# Altium schematic symbol library Electronic Devices_LIB.SchLib: 703 symbols (part 3 of 8) (continued)
## IC_FLASH_MEMORY_SPI_AT25DF321A-MH-T
designator U?, comment Supplier Part Number 1: 1265-1076-1-ND  (hidden comment: AT25DF321A-MH-T)
Manufacturer: Renesas; Supplier 1: Digi-Key; Manufacturer Part Number: AT25DF321A-MH-T; RoHS: No; Stock 1: 101167; Pricing 1: 1=3.63, 10=3.297, 25=3.2252, 50=3.2078, 100=2.8762, 250=2.86576, 500=2.76104, 1000=2.6249 (USD)

## IC_FLASH_SPI_32MB_AT25DF321A-SH-B
designator U?, comment AT25DF321A-SH-B
FLASH Memory IC 32Mbit SPI 100 MHz 8-SOIC; Manufacturer: Renesas; Supplier 1: Digi-Key; Manufacturer Part Number: AT25DF321A-SH-B; RoHS: No; Category: Memory; Stock 1: 39259; Pricing 1: 1=2.76, 10=2.478, 25=2.4396, 50=2.4332, 100=2.1742, 250=2.10276, 500=2.09512, 1000=1.95093, 5000=1.76592 (USD); Supplier Part Number 1: 1265-1029-5-ND
footprint IC_FLASH_SOIC127P798X216-8N (8-SOIC)
pins: 1 ~{CS}, 2 SO_(SOI), 3 ~{WP}, 4 GND, 5 SI_(SIO), 6 SCK, 7 ~{HOLD}, 8 VCC

## IC_IMU_6AXIS_BMI055-SHUTL
designator U?, comment BMI055-SHUTL
Eval Board For BMI055; Manufacturer: Bosch Sensortec; Interface: I2C,SPI; Evaluation Kit: Yes; Sensor Type: Accelerometer,Gyroscope,3 Axis; Supplier 1: Digi-Key; Manufacturer Part Number: BMI055-SHUTL; RoHS: Yes; ComponentLink1URL: https://ae-bst.resource.bosch.com/media/_tech/media/shuttleboard_flyer/BST-DHW-FL020.pdf?src-supplier=Digi-Key; ComponentLink1Description: https://ae-bst.resource.bosch.com/media/_tech/media/shuttleboard_flyer/BST-DHW-FL020.pdf?src-supplier=Digi-Key; Supplier Part Number 1: 828-1051-ND
footprint IC_IMU_Bosch_Sensortec_0_MFG (16-LGA (4.5x3))
footprint Model Name (Model Description)
pins: 1 INT2, 2 NC, 3 VDD, 4 GNDA, 5 CSB2, 6 GNDIO, 7 PS, 8 SCx, 9 SDx, 10 SDO2, 11 VDDIO, 12 INT3, 13 INT4, 14 CSB1, 15 SDO1, 16 INT1

## IC_IMU_6AXIS_BMI270
designator U?, comment BMI270
BMI270 Series 3.6 V 685 µA Smart Ultra-low Power Inertial Measurement Unit; Manufacturer: Bosch Tools; Supplier 1: Digikey; Manufacturer Part Number: BMI270; RoHS: No; Category: Inertial Measurement Units (IMUs); Stock 1: 18476; Pricing 1: 1=5.88, 10=4.409, 25=3.9188, 50=3.7228, 100=3.6249, 500=3.03708, 1000=2.84113 (USD); Supplier Part Number 1: 828-1091-1-ND
footprint IC_IMU_QFN50P300X250X87-14N (14-LGA (2.5x3))
pins: 1 SDO, 2 ASDX, 3 ASCX, 4 INT1, 5 VDDIO, 6 GNDIO, 7 GND, 8 VDD, 9 INT2, 10 OCSB, 11 OSDO, 12 CSB, 13 SCX, 14 SDX

## IC_IMU_9AXIS_ICM-20948
designator U?, comment ICM-20948
IMU (Inertial Measurement Unit), 9-Axis, Accelerometer, Gyroscope, Compass; Manufacturer: TDK; Sensor Type: Accelerometer,Gyroscope,Magnetometer; Output Type: SPI,I2C; Max Supply Voltage: 3.6V; Min Supply Voltage: 1.71V; Supplier 1: Mouser; Manufacturer Part Number: ICM-20948; RoHS: Yes; Category: Inertial Measurement Units (IMUs); Stock 1: 38177; Pricing 1: 1=8.32, 10=6.38, 50=6.38, 100=5.45, 250=5.41, 500=5.13, 1000=4.8, 2500=4.76, 5000=4.61, 10000=4.61 (USD); Mount: Surface Mount; Case/Package: QFN; Min Operating Temperature: -40°C; Max Operating Temperature: 85°C; Series: -; Packaging: Cut Tape; Length: 3mm; Width: 3mm; Height: 1.05mm; ComponentLink1URL: http://www.farnell.com/datasheets/2632662.pdf?src-supplier=Farnell; ComponentLink1Description: http://www.farnell.com/datasheets/2632662.pdf?src-supplier=Farnell; ComponentLink2URL: https://www.invensense.com/wp-content/uploads/2016/06/App-Note-eMD-20x48-User-Guide.pdf?src-supplier=Digikey; ComponentLink2Description: https://www.invensense.com/wp-content/uploads/2016/06/App-Note-eMD-20x48-User-Guide.pdf?src-supplier=Digikey; ComponentLink3URL: http://www.farnell.com/datasheets/2632662.pdf?src-supplier=Element14; ComponentLink3Description: http://www.farnell.com/datasheets/2632662.pdf?src-supplier=Element14; ComponentLink4URL: http://www.farnell.com/datasheets/2632662.pdf?src-supplier=Newark; ComponentLink4Description: http://www.farnell.com/datasheets/2632662.pdf?src-supplier=Newark; ComponentLink5URL: https://www.invensense.com/wp-content/uploads/2016/06/App-Note-eMD-20x48-User-Guide.pdf?src-supplier=Avnet; ComponentLink5Description: https://www.invensense.com/wp-content/uploads/2016/06/App-Note-eMD-20x48-User-Guide.pdf?src-supplier=Avnet; ComponentLink6URL: https://www.invensense.com/wp-content/uploads/2016/06/App-Note-eMD-20x48-User-Guide.pdf?src-supplier=Component+Distributors+Inc.; ComponentLink6Description: https://www.invensense.com/wp-content/uploads/2016/06/App-Note-eMD-20x48-User-Guide.pdf?src-supplier=Component+Distributors+Inc.; Supplier Part Number 1: 410-ICM-20948
footprint IC_IMU_TDK_InvenSense_0_IPC_A (QFN 3.0x3.0x0.9)
pins: 1 NC, 2 NC, 3 NC, 4 NC, 5 NC, 6 NC, 7 AUX CL, 8 VDDIO (power), 9 SDO/AD0 (in), 10 REGOUT (out), 11 FSYNC (in), 12 INT1 (out), 13 VDD (power), 14 NC, 15 NC, 16 NC, 17 NC, 18 GND (power), 19 RESERVED, 20 RESERVED, 21 AUX DA, 22 ~{CS} (in), 23 SCL/SCLK (in), 24 SDA/SDI (in)

## IC_INTERFACE_USB_UART_FT231XS-R
designator U?, comment FT231XS-R
FT231XS-R Interface RS232, RS422, RS485, SIE, UART 3MBd, 5 V, 20-Pin, SSOP; Manufacturer: FTDI; Max Supply Voltage: 5.5V; Min Supply Voltage: 2.97V; Number of Channels: 1; Operating Supply Voltage: 5V; Data Rate: 12Mbps; Interface: UART,USB; Operating Supply Current: 8mA; Supplier 1: Digi-Key; Manufacturer Part Number: FT231XS-R; RoHS: Yes; Category: Interface ICs; Stock 1: 113652; Pricing 1: 1=2.34, 25=2.27, 100=2.2, 250=2, 500=1.825 (USD); Mount: Surface Mount; Case/Package: SSOP; Number of Pins: 20; Weight: 0.016oz; Min Operating Temperature: -40°C; Max Operating Temperature: 85°C; Packaging: Tape and Reel; Package Quantity: 1; Series: USBmadeEZ-UART, FT-X, X-Chip; Length: 8.74mm; Width: 0.157inch; Height: 0.059inch; Radiation Hardening: No; RoHS Compliant: Yes; ComponentLink1URL: https://datasheet.ciiva.com/30478/0900766b811020d3-30478147.pdf?src-supplier=Rs; ComponentLink1Description: https://datasheet.ciiva.com/30478/0900766b811020d3-30478147.pdf?src-supplier=Rs; ComponentLink2URL: https://datasheet.ciiva.com/1787/ft-x-series-1787028.pdf?src-supplier=Digi-Key; ComponentLink2Description: https://datasheet.ciiva.com/1787/ft-x-series-1787028.pdf?src-supplier=Digi-Key; ComponentLink3URL: https://datasheet.ciiva.com/1787/ft-x-series-1787029.pdf?src-supplier=Digi-Key; ComponentLink3Description: https://datasheet.ciiva.com/1787/ft-x-series-1787029.pdf?src-supplier=Digi-Key; ComponentLink4URL: https://datasheet.ciiva.com/1787/ft-x-series-1787030.pdf?src-supplier=Digi-Key; ComponentLink4Description: https://datasheet.ciiva.com/1787/ft-x-series-1787030.pdf?src-supplier=Digi-Key; ComponentLink5URL: https://datasheet.ciiva.com/48909/70403932-48909078.pdf?src-supplier=Allied+Electronics; ComponentLink5Description: https://datasheet.ciiva.com/48909/70403932-48909078.pdf?src-supplier=Allied+Electronics; Supplier Part Number 1: 768-1129-1-ND
footprint IC_CONTROLLER_USB_UART_SOP64P599X175-20N (20-SSOP (0.154", 3.90mm Width))
pins: 1 DTR#, 2 RTS#, 3 VCCIO, 4 RXD, 5 RI#, 6 GND_1, 7 DSR#, 8 DCD#, 9 CTS#, 10 CBUS2, 11 USBDP, 12 USBDM, 13 3V3OUT, 14 RESET#, 15 VCC, 16 GND_2, 17 CBUS1, 18 CBUS0, 19 CBUS3, 20 TXD

## IC_LED_DRIVER_TCA6507PWR
designator U?, comment TCA6507PWR
Led Driver 7 Segment 14-PIN TSSOP T/r / IC Led Drvr Lin Dim 40MA 14TSSOP; Manufacturer: Texas Instruments; Number of Outputs: 7; Frequency: 400kHz; Max Supply Voltage: 3.6V; Min Supply Voltage: 1.65V; Output Voltage: 5.5V; Dimming: I²C,SMBUS; Max Supply Current: 25uA; Topology: Boost; Operating Frequency: 400 kHz; Supplier 1: Digikey; Manufacturer Part Number: TCA6507PWR; RoHS: Yes; Category: LED Drivers; Stock 1: 2932; Pricing 1: 1=1.59, 10=1.429, 25=1.3484, 100=1.1488, 250=1.07868, 500=0.94384, 1000=0.78204 (USD); Case/Package: TSSOP; Number of Pins: 14; Weight: 0.002018oz; Min Operating Temperature: -40°C; Max Operating Temperature: 85°C; Package Quantity: 2000; Packaging: Tape and Reel; Low Level Output Current: 40mA; Number of Segments: 7; Series: -; Output Current per Channel: 40mA; Output Current: 40mA; Radiation Hardening: No; Lead Free: Lead Free; RoHS Compliant: Yes; ComponentLink1URL: https://datasheet.ciiva.com/4427/scps164b-101011-4427013.pdf?src-supplier=Mouser; ComponentLink1Description: https://datasheet.ciiva.com/4427/scps164b-101011-4427013.pdf?src-supplier=Mouser; ComponentLink2URL: https://datasheet.ciiva.com/1945/tca6507-1945456.pdf?src-supplier=Digikey; ComponentLink2Description: https://datasheet.ciiva.com/1945/tca6507-1945456.pdf?src-supplier=Digikey; ComponentLink3URL: https://datasheet.ciiva.com/15135/getdatasheetpartid-48590-15135908.pdf?src-supplier=Verical; ComponentLink3Description: https://datasheet.ciiva.com/15135/getdatasheetpartid-48590-15135908.pdf?src-supplier=Verical; ComponentLink4URL: https://datasheet.ciiva.com/3164/tca6507-3164040.pdf?src-supplier=Avnet; ComponentLink4Description: https://datasheet.ciiva.com/3164/tca6507-3164040.pdf?src-supplier=Avnet; ComponentLink5URL: https://datasheet.ciiva.com/1945/tca6507-1945457.pdf?src-supplier=Digikey; ComponentLink5Description: https://datasheet.ciiva.com/1945/tca6507-1945457.pdf?src-supplier=Digikey; ComponentLink6URL: https://datasheet.ciiva.com/1945/tca6507-1945458.pdf?src-supplier=Digikey; ComponentLink6Description: https://datasheet.ciiva.com/1945/tca6507-1945458.pdf?src-supplier=Digikey; Supplier Part Number 1: 296-22777-1-ND
footprint IC_LED_DRIVER_SOP65P640X120-14N (14-TSSOP (0.173", 4.40mm Width))
pins: 1 VCC, 2 SCL, 3 SDA, 4 EN, 5 GND, 6 NC_1, 7 NC_2, 8 P0, 9 P1, 10 P2, 11 P3, 12 P4, 13 P5, 14 P6

## IC_LEVEL_TRASLATOR_NTS0104GU12,115
designator U?, comment NTS0104GU12,115
NTS0104 Series 50 Mbps Dual Supply 3-ST O-DRN Translating Transceiver- XQFN-12; Manufacturer: NXP Semiconductors; Logic Function: Translator; Low Level Output Current: 1mA; High Level Output Current: -20uA; Quiescent Current: 45uA; Data Rate: 50Mbps; Number of Channels: 4; Propagation Delay: 4.4ns; Max Supply Voltage: 5.5V; Min Supply Voltage: 1.65V; Max Power Dissipation: 250mW; Turn-On Delay Time: 5.8ns; Output Type: Voltage; Supplier 1: Digikey; Manufacturer Part Number: NTS0104GU12,115; RoHS: Yes; Category: Voltage Level Shifters; Stock 1: 126626; Pricing 1: 1=1.16, 10=1.034, 25=0.982, 100=0.8065, 250=0.75396, 500=0.66628, 1000=0.52601 (USD); Mount: Surface Mount; Number of Pins: 12; Min Operating Temperature: -40°C; Max Operating Temperature: 125°C; Packaging: Tape and Reel; Package Quantity: 1; Number of Bits: 4; Series: -; Lead Free: Lead Free; RoHS Compliant: Yes; ComponentLink1URL: https://datasheet.ciiva.com/1899/nts0104-1899088.pdf?src-supplier=Digikey; ComponentLink1Description: https://datasheet.ciiva.com/1899/nts0104-1899088.pdf?src-supplier=Digikey; ComponentLink2URL: https://datasheet.ciiva.com/4834/nts0104-92130-4834865.pdf?src-supplier=Mouser; ComponentLink2Description: https://datasheet.ciiva.com/4834/nts0104-92130-4834865.pdf?src-supplier=Mouser; ComponentLink3URL: https://datasheet.ciiva.com/1899/nts0104-1899089.pdf?src-supplier=Digikey; ComponentLink3Description: https://datasheet.ciiva.com/1899/nts0104-1899089.pdf?src-supplier=Digikey; ComponentLink4URL: https://datasheet.ciiva.com/1899/nts0104-1899090.pdf?src-supplier=Digikey; ComponentLink4Description: https://datasheet.ciiva.com/1899/nts0104-1899090.pdf?src-supplier=Digikey; ComponentLink5URL: https://datasheet.ciiva.com/8244/nts0104-8244168.pdf?src-supplier=Avnet; ComponentLink5Description: https://datasheet.ciiva.com/8244/nts0104-8244168.pdf?src-supplier=Avnet; Supplier Part Number 1: 568-8408-1-ND
footprint IC_LEVEL_TRASLATOR_XQFN12_0P4_1P8X2P1 (XQFN12_0P4_1P8X2P1)
pins: 1 VCC(A), 2 A1, 3 A2, 4 A3, 5 A4, 6 GND, 7 B4, 8 B3, 9 B2, 10 B1, 11 VCC(B), 12 OE

## IC_LEVEL_TRASLATOR_TCA9406DCUR
designator U?, comment TCA9406DCUR
Voltage Level Translator Bidirectional 1 Circuit 2 Channel 24Mbps US8; Manufacturer: Texas Instruments; Propagation Delay: 260ns; Min Supply Voltage: 1.65V; Max Supply Voltage: 5.5V; Number of Outputs: 2; High Level Output Current: -50mA; Low Level Output Current: 50mA; Number of Circuits: 1; Supplier 1: Mouser; Manufacturer Part Number: TCA9406DCUR; RoHS: Yes; Category: Voltage Level Shifters; Stock 1: 11492; Pricing 1: 1=0.84, 10=0.536, 50=0.536, 100=0.439, 500=0.419, 1000=0.396, 3000=0.387, 6000=0.378, 9000=0.372, 10000=0.372, 24000=0.357 (USD); Case/Package: VSSOP; Number of Pins: 8; Weight: 0.00067oz; Min Operating Temperature: -40°C; Max Operating Temperature: 85°C; Package Quantity: 3000; Data Rate: 24Mbps; Packaging: Tape and Reel; Logic Function: Translator; Series: TCA; Channel Type: Bidirectional; Length: 2.1mm; Width: 2.4mm; Height: 0.8mm; Radiation Hardening: No; Reach SVHC Compliant: No; Lead Free: Lead Free; RoHS Compliant: Yes; ComponentLink1URL: https://datasheet.ciiva.com/1899/tca9406-1899424.pdf?src-supplier=Digikey; ComponentLink1Description: https://datasheet.ciiva.com/1899/tca9406-1899424.pdf?src-supplier=Digikey; ComponentLink2URL: https://datasheet.ciiva.com/3149/tca9406-3149521.pdf?src-supplier=Avnet; ComponentLink2Description: https://datasheet.ciiva.com/3149/tca9406-3149521.pdf?src-supplier=Avnet; ComponentLink3URL: https://datasheet.ciiva.com/15134/getdatasheetpartid-312405-15134730.pdf?src-supplier=Verical; ComponentLink3Description: https://datasheet.ciiva.com/15134/getdatasheetpartid-312405-15134730.pdf?src-supplier=Verical; ComponentLink4URL: https://datasheet.ciiva.com/1899/tca9406-1899423.pdf?src-supplier=Digikey; ComponentLink4Description: https://datasheet.ciiva.com/1899/tca9406-1899423.pdf?src-supplier=Digikey; ComponentLink5URL: https://datasheet.ciiva.com/1899/tca9406-1899425.pdf?src-supplier=Digikey; ComponentLink5Description: https://datasheet.ciiva.com/1899/tca9406-1899425.pdf?src-supplier=Digikey; ComponentLink6URL: https://datasheet.ciiva.com/1503/1882429-1503921.pdf?src-supplier=Element14; ComponentLink6Description: https://datasheet.ciiva.com/1503/1882429-1503921.pdf?src-supplier=Element14; ComponentLink7URL: https://datasheet.ciiva.com/46391/1817453-46391351.pdf?src-supplier=Element14; ComponentLink7Description: https://datasheet.ciiva.com/46391/1817453-46391351.pdf?src-supplier=Element14; Supplier Part Number 1: 595-TCA9406DCUR
footprint IC_LEVEL_TRASLATOR_SOP50P310X90-8N
pins: 1 SDA_B, 2 GND (power), 3 VCCA (power), 4 SDA_A, 5 SCL_A, 6 OE, 7 VCCB (power), 8 SCL_B

## IC_MAGNETORESISTIVE_3AXIS_MMC5633NJL
designator U?, comment MMC5633NJL
30 Gauss, Monolithic, High Perfo; Manufacturer: Memsic; Supplier 1: Digikey; Manufacturer Part Number: MMC5633NJL; RoHS: No; Stock 1: 15722; Pricing 1: 1=1.41, 10=1.054, 25=0.8436, 100=0.7733, 500=0.65024, 1000=0.57994, 5000=0.52722 (USD); Supplier Part Number 1: 1267-MMC5633NJLCT-ND
footprint IC_MAGNETORESISTIVE_3AXIS_BGA4C40P2X2_85X85X60
pins: A1 VSA, A2 SCL, B1 VDD, B2 SDA

## IC_MCU_ARM_16KB_STM32F030F4P6TR
designator U?, comment STM32F030F4P6TR
ARM® Cortex®-M0 STM32 F0 Microcontroller IC 32-Bit 48MHz 16KB (16K x 8) FLASH 20-TSSOP; Manufacturer: STMicroelectronics; RAM Size: 4KB; Max Power Dissipation: 182mW; Interface: I2C,SPI,UART,USART; Number of I/Os: 15; Number of Timers/Counters: 10; Min Supply Voltage: 2.3V; Max Supply Voltage: 3.6V; Oscillator Type: Internal; Data Bus Width: 32b; Number of ADC Channels: 1; Watchdog Timer: Yes; Peripherals: POR,PWM,WDT,DMA; Core Architecture: ARM; Operating Supply Voltage: 3.3V; Supplier 1: Digi-Key; Manufacturer Part Number: STM32F030F4P6TR; RoHS: Yes; Category: Microcontrollers; Stock 1: 40000; Pricing 1: 2500=0.8091 (USD); Mount: Surface Mount; Case/Package: TSSOP; Number of Pins: 20; Weight: 0.006737oz; Min Operating Temperature: -40°C; Max Operating Temperature: 85°C; Packaging: Tape and Reel; Package Quantity: 2500; Frequency: 48MHz; Number of Programmable I/O: 15; Max Frequency: 48MHz; Number of SPI Channels: 1; Number of I2C Channels: 1; Memory Type: FLASH; Memory Size: 16KB; Series: STM32F0; Length: 6.6mm; Width: 4.5mm; Height: 1.05mm; Radiation Hardening: No; Reach SVHC Compliant: No; Lead Free: Lead Free; RoHS Compliant: Yes; ComponentLink1URL: https://datasheet.ciiva.com/29719/dm00088500-29719196.pdf?src-supplier=Digi-Key; ComponentLink1Description: https://datasheet.ciiva.com/29719/dm00088500-29719196.pdf?src-supplier=Digi-Key; ComponentLink2URL: https://datasheet.ciiva.com/29987/dm00088500-29987016.pdf?src-supplier=Avnet; ComponentLink2Description: https://datasheet.ciiva.com/29987/dm00088500-29987016.pdf?src-supplier=Avnet; ComponentLink3URL: https://datasheet.ciiva.com/46427/1792126-46427290.pdf?src-supplier=Element14; ComponentLink3Description: https://datasheet.ciiva.com/46427/1792126-46427290.pdf?src-supplier=Element14; Supplier Part Number 1: 497-17333-2-ND
footprint IC_MCU_STM_20-TSSOP (20-TSSOP  (0.173", 4.40mm Width) Pitch 0.65mm)
pins: 1 BOOT0, 2 PF0-OSC_IN, 3 PF1-OSC_OUT, 4 NRST, 5 VDDA, 6 PA0, 7 PA1, 8 PA2, 9 PA3, 10 PA4, 11 PA5, 12 PA6, 13 PA7, 14 PB1, 15 VSS, 16 VDD, 17 PA9, 18 PA10, 19 PA13, 20 PA14

## IC_MCU_ARM_32BIT_STM32H562VGT6
designator U?, comment STM32H562VGT6
RISC Microcontroller, 32-Bit, FLASH, CORTEX-M4F CPU, 180MHz, CMOS, PBGA216; Manufacturer: STMicroelectronics; Supplier 1: Digikey; Manufacturer Part Number: STM32H562VGT6; RoHS: No; Category: Microcontrollers; Pricing 1: 540=4.68461 (USD); Supplier Part Number 1: 497-STM32H562VGT6-ND
footprint IC_MCU_STM_QFP50P1600X1600X160-100N - duplicate
part A pins: 6 VBAT, 8 PC14-_OSC32_IN, 9 PC15-_OSC32_OUT, 10 VSS_1, 11 VDD_1, 12 PH0_-_OSC_IN, 13 PH1_-_OSC_OUT, 14 NRST, 19 VSSA, 20 VREF-, 21 VREF+, 22 VDDA, 27 VSS_2, 28 VDD_2, 48 VCAP_1, 49 VSS_3, 50 VDD_3, 73 VDDUSB, 74 VSS_4, 75 VDD_4, 94 BOOT0, 98 VCAP_2, 99 VSS_5, 100 VDD_5
part B pins: 1 PE2, 2 PE3, 3 PE4, 4 PE5, 5 PE6, 7 PC13, 15 PC0, 16 PC1, 17 PC2, 18 PC3, 23 PA0, 24 PA1, 25 PA2, 26 PA3, 29 PA4, 30 PA5, 31 PA6, 32 PA7, 33 PC4, 34 PC5, 35 PB0, 36 PB1, 37 PB2, 38 PE7, 39 PE8, 40 PE9, 41 PE10, 42 PE11, 43 PE12, 44 PE13, 45 PE14, 46 PE15, 47 PB10, 51 PB12, 52 PB13, 53 PB14, 54 PB15, 55 PD8, 56 PD9, 57 PD10, 58 PD11, 59 PD12, 60 PD13, 61 PD14, 62 PD15, 63 PC6, 64 PC7, 65 PC8, 66 PC9, 67 PA8, 68 PA9, 69 PA10, 70 PA11, 71 PA12, 72 PA13, 76 PA14, 77 PA15, 78 PC10, 79 PC11, 80 PC12, 81 PD0, 82 PD1, 83 PD2, 84 PD3, 85 PD4, 86 PD5, 87 PD6, 88 PD7, 89 PB3, 90 PB4, 91 PB5, 92 PB6, 93 PB7, 95 PB8, 96 PB9, 97 PE0

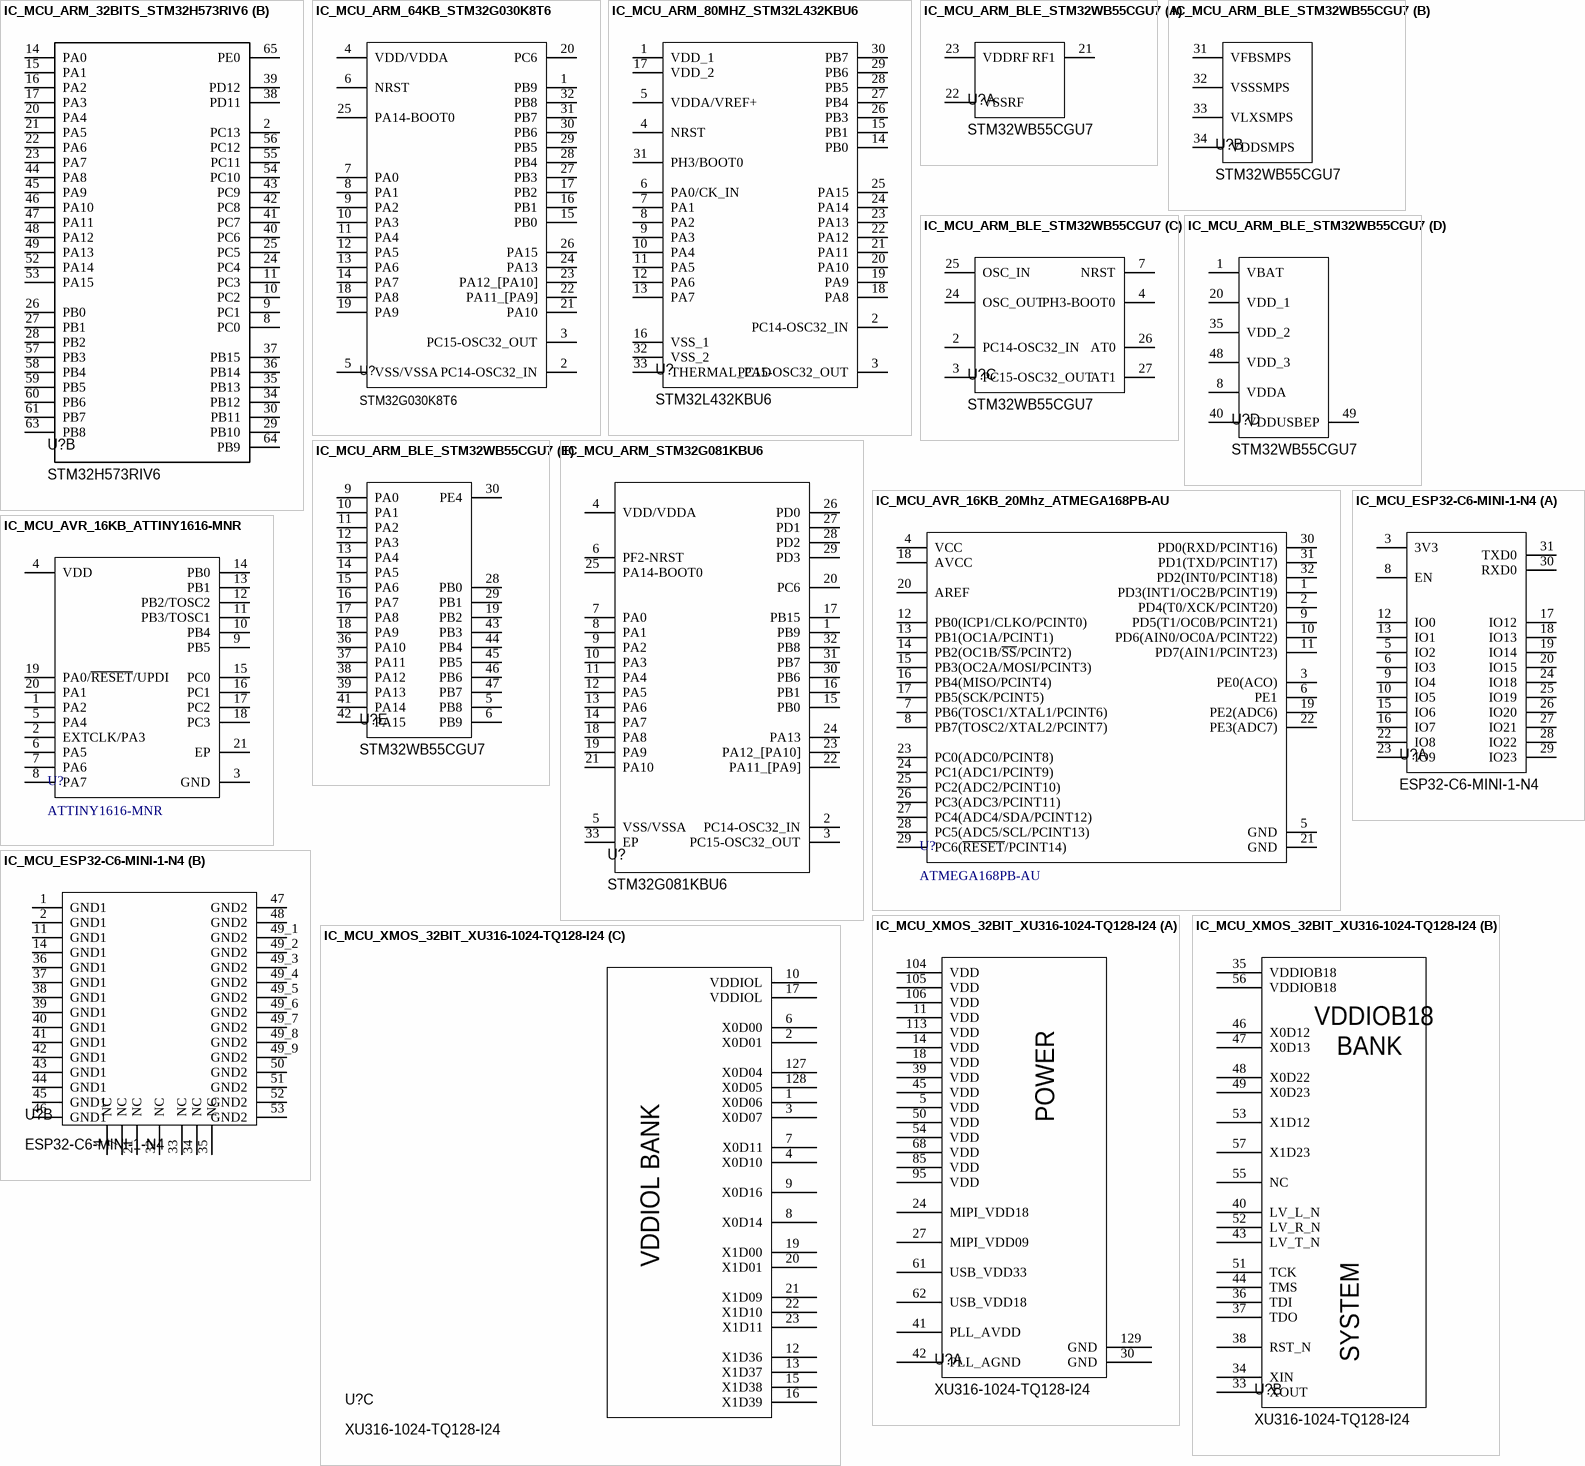
[diagram p12: symbols IC_MCU_ARM_32BITS_STM32H573RIV6 to IC_MCU_XMOS_32BIT_XU316-1024-TQ128-I24]

## IC_MCU_ARM_32BITS_STM32H573RIV6
designator U?, comment STM32H573RIV6
MCU 32-bit ARM Cortex M33 RISC 2MB Flash 1.8V/2.5V/3.3V 68-Pin VFQFPN EP Tray; Manufacturer: STMicroelectronics; Supplier 1: Digikey; Manufacturer Part Number: STM32H573RIV6; RoHS: No; Stock 1: 2947; Pricing 1: 1=8.96, 10=8.093, 25=7.7168, 80=6.70038, 230=6.39926, 440=5.83461, 945=5.08177 (USD); Supplier Part Number 1: 497-STM32H573RIV6-ND
footprint IC_MCU_STM_QFN40P800X800X100-69N-D
part A pins: 1 VBAT, 3 PC14-OSC32_IN, 4 PC15-OSC32_OUT, 5 PH0-OSC_IN, 6 PH1-OSC_OUT, 7 NRST, 12 VSSA, 13 VDDA, 18 VSS_1, 19 VDD_1, 31 VCAP_1, 32 VSS_2, 33 VDD_2, 50 VSS_3, 51 VDD_3, 62 BOOT0, 66 VCAP_2, 67 VSS_4, 68 VDD_4, 69 EP
part B pins: 2 PC13, 8 PC0, 9 PC1, 10 PC2, 11 PC3, 14 PA0, 15 PA1, 16 PA2, 17 PA3, 20 PA4, 21 PA5, 22 PA6, 23 PA7, 24 PC4, 25 PC5, 26 PB0, 27 PB1, 28 PB2, 29 PB10, 30 PB11, 34 PB12, 35 PB13, 36 PB14, 37 PB15, 38 PD11, 39 PD12, 40 PC6, 41 PC7, 42 PC8, 43 PC9, 44 PA8, 45 PA9, 46 PA10, 47 PA11, 48 PA12, 49 PA13, 52 PA14, 53 PA15, 54 PC10, 55 PC11, 56 PC12, 57 PB3, 58 PB4, 59 PB5, 60 PB6, 61 PB7, 63 PB8, 64 PB9, 65 PE0

## IC_MCU_ARM_64KB_STM32G030K8T6
designator U?, comment STM32G030K8T6
Microcontroller 32-bit ARM Cortex-M0+ RISC 64KB Flash 3.3V 32-Pin LQFP Tray; Manufacturer: STMicroelectronics; Supplier 1: Digi-Key; Manufacturer Part Number: STM32G030K8T6; RoHS: Yes; Category: Microcontrollers; Stock 1: 103267; Pricing 1: 1=2.04, 10=1.835, 25=1.7308, 80=1.4745, 230=1.38452, 440=1.21145, 1500=1.00379, 3000=0.98895 (USD); RoHS Compliant: Yes; ComponentLink1URL: http://www.farnell.com/datasheets/2864618.pdf?src-supplier=Farnell; ComponentLink1Description: http://www.farnell.com/datasheets/2864618.pdf?src-supplier=Farnell; ComponentLink2URL: https://datasheet.octopart.com/STM32G030K8T6-STMicroelectronics-datasheet-137692524.pdf?src-supplier=TME; ComponentLink2Description: https://datasheet.octopart.com/STM32G030K8T6-STMicroelectronics-datasheet-137692524.pdf?src-supplier=TME; Supplier Part Number 1: 497-19770-ND
footprint IC_MCU_STM_QFP80P900X900X160-32N (32-LQFP (7x7))
pins: 1 PB9, 2 PC14-OSC32_IN, 3 PC15-OSC32_OUT, 4 VDD/VDDA, 5 VSS/VSSA, 6 NRST, 7 PA0, 8 PA1, 9 PA2, 10 PA3, 11 PA4, 12 PA5, 13 PA6, 14 PA7, 15 PB0, 16 PB1, 17 PB2, 18 PA8, 19 PA9, 20 PC6, 21 PA10, 22 PA11_[PA9], 23 PA12_[PA10], 24 PA13, 25 PA14-BOOT0, 26 PA15, 27 PB3, 28 PB4, 29 PB5, 30 PB6, 31 PB7, 32 PB8

## IC_MCU_ARM_80MHZ_STM32L432KBU6
designator U?, comment STM32L432KBU6
Ultra-low-power with FPU ARM Cortex-M4 MCU 80 MHz with 128 Kbytes Flash, USB; Manufacturer: STMicroelectronics; Interface: I2C,SPI,USB,IrDA,UART,USART; Peripherals: Brown-out Detect/Reset,PWM,WDT,DMA; Number of I/Os: 26; Memory Size: 128KB; Oscillator Type: Internal; Supplier 1: Digi-Key; Manufacturer Part Number: STM32L432KBU6; RoHS: Yes; Category: Microcontrollers; Stock 1: 347; Pricing 1: 1=5.85, 10=5.256, 25=4.9692, 80=4.30675, 230=4.08587, 440=3.66623, 945=3.09199, 2940=2.93739 (USD); Case/Package: UFQFPN; Min Operating Temperature: -40°C; Max Operating Temperature: 85°C; Memory Type: FLASH; Core Architecture: ARM; Series: STM32L4; Packaging: Tray; RoHS Compliant: Yes; ComponentLink1URL: http://www.farnell.com/datasheets/2283391.pdf?src-supplier=Farnell; ComponentLink1Description: http://www.farnell.com/datasheets/2283391.pdf?src-supplier=Farnell; ComponentLink2URL: http://www.st.com/content/ccc/resource/technical/document/datasheet/24/01/9f/59/f0/83/47/fc/DM00257205.pdf/files/DM00257205.pdf/jcr:content/translations/en.DM00257205.pdf?src-supplier=Digi-Key; ComponentLink2Description: http://www.st.com/content/ccc/resource/technical/document/datasheet/24/01/9f/59/f0/83/47/fc/DM00257205.pdf/files/DM00257205.pdf/jcr:content/translations/en.DM00257205.pdf?src-supplier=Digi-Key; ComponentLink3URL: http://www.farnell.com/datasheets/2283391.pdf?src-supplier=Newark; ComponentLink3Description: http://www.farnell.com/datasheets/2283391.pdf?src-supplier=Newark; ComponentLink4URL: https://datasheet.octopart.com/STM32L432KBU6-STMicroelectronics-datasheet-62336852.pdf?src-supplier=SHENGYU+ELECTRONICS; ComponentLink4Description: https://datasheet.octopart.com/STM32L432KBU6-STMicroelectronics-datasheet-62336852.pdf?src-supplier=SHENGYU+ELECTRONICS; ComponentLink5URL: https://datasheet.octopart.com/STM32L432KBU6-STMicroelectronics-datasheet-137130199.pdf?src-supplier=TME; ComponentLink5Description: https://datasheet.octopart.com/STM32L432KBU6-STMicroelectronics-datasheet-137130199.pdf?src-supplier=TME; Supplier Part Number 1: 497-16577-ND
footprint IC_MCU_STM_QFN50P500X500X60-33N-D (32-UFQFPN (5x5))
pins: 1 VDD_1, 2 PC14-OSC32_IN, 3 PC15-OSC32_OUT, 4 NRST, 5 VDDA/VREF+, 6 PA0/CK_IN, 7 PA1, 8 PA2, 9 PA3, 10 PA4, 11 PA5, 12 PA6, 13 PA7, 14 PB0, 15 PB1, 16 VSS_1, 17 VDD_2, 18 PA8, 19 PA9, 20 PA10, 21 PA11, 22 PA12, 23 PA13, 24 PA14, 25 PA15, 26 PB3, 27 PB4, 28 PB5, 29 PB6, 30 PB7, 31 PH3/BOOT0, 32 VSS_2, 33 THERMAL_PAD

## IC_MCU_ARM_BLE_STM32WB55CGU7
designator U?, comment STM32WB55CGU7
MCU 32-Bit STM32WB55 ARM Cortex M4F/ARM Cortex M0+ RISC 1MB Flash 1.71V to 3.6V 48-Pin UFQFPN Tray; Manufacturer: STMicroelectronics; Supplier 1: Digi-Key; Manufacturer Part Number: STM32WB55CGU7; RoHS: Yes; Category: Microcontrollers; Stock 1: 4520; Pricing 1: 1=8.38, 10=7.574, 25=7.2216, 80=6.27038, 230=5.98857, 440=5.46016, 1560=4.75562 (USD); Supplier Part Number 1: STM32WB55CGU7-ND; Supplier 2: Mouser
footprint IC_MCU_STM_QFN50P700X700X60-49N-D (48-UFQFPN (7x7), 0.5mm Pitch)
part A pins: 21 RF1, 22 VSSRF, 23 VDDRF
part B pins: 31 VFBSMPS, 32 VSSSMPS, 33 VLXSMPS, 34 VDDSMPS
part C pins: 2 PC14-OSC32_IN, 3 PC15-OSC32_OUT, 4 PH3-BOOT0, 7 NRST, 24 OSC_OUT, 25 OSC_IN, 26 AT0, 27 AT1
part D pins: 1 VBAT, 8 VDDA, 20 VDD_1, 35 VDD_2, 40 VDDUSB, 48 VDD_3, 49 EP
part E pins: 5 PB8, 6 PB9, 9 PA0, 10 PA1, 11 PA2, 12 PA3, 13 PA4, 14 PA5, 15 PA6, 16 PA7, 17 PA8, 18 PA9, 19 PB2, 28 PB0, 29 PB1, 30 PE4, 36 PA10, 37 PA11, 38 PA12, 39 PA13, 41 PA14, 42 PA15, 43 PB3, 44 PB4, 45 PB5, 46 PB6, 47 PB7

## IC_MCU_ARM_STM32G081KBU6
designator U?, comment STM32G081KBU6
Microcontroller 32-Bit ARM Cortex-M0 RISC 128K-Byte Flash 3.3V 32-Pin UFQFPN; Manufacturer: STMicroelectronics; Supplier 1: Digi-Key; Manufacturer Part Number: STM32G081KBU6; RoHS: Yes; Category: Microcontrollers; Stock 1: 1951; Pricing 1: 1=4.33, 10=3.891, 25=3.6784, 80=3.18788, 230=3.02435, 440=2.71375, 945=2.2887, 2940=2.17427 (USD); Supplier Part Number 1: 497-STM32G081KBU6-ND
footprint IC_MCU_STM_QFN50P500X500X60-33N-D (32-UFQFPN (5x5))
pins: 1 PB9, 2 PC14-OSC32_IN, 3 PC15-OSC32_OUT, 4 VDD/VDDA, 5 VSS/VSSA, 6 PF2-NRST, 7 PA0, 8 PA1, 9 PA2, 10 PA3, 11 PA4, 12 PA5, 13 PA6, 14 PA7, 15 PB0, 16 PB1, 17 PB15, 18 PA8, 19 PA9, 20 PC6, 21 PA10, 22 PA11_[PA9], 23 PA12_[PA10], 24 PA13, 25 PA14-BOOT0, 26 PD0, 27 PD1, 28 PD2, 29 PD3, 30 PB6, 31 PB7, 32 PB8, 33 EP

## IC_MCU_AVR_16KB_20Mhz_ATMEGA168PB-AU
designator U?, comment ATMEGA168PB-AU
MCU 8-bit ATmega AVR RISC 16KB Flash 2.5V/3.3V/5V Automotive 32-Pin TQFP; Manufacturer: Microchip; Frequency: 20MHz; Interface: I2C,SPI,USART,UART; Number of I/Os: 27; Oscillator Type: Internal; Peripherals: Brown-out Detect/Reset,POR,PWM,WDT; Data Bus Width: 8b; RAM Size: 1KB; Number of ADC Channels: 8; Number of SPI Channels: 1; Number of PWM Channels: 6; Number of Timers/Counters: 3; Min Supply Voltage: 1.8V; Max Supply Voltage: 5.5V; Manufacturer Part Number: ATMEGA168PB-AU; RoHS: No; Category: Uncategorized; Stock 1: 17984; Pricing 1: 1=1.73000, 25=1.58720, 100=1.44000 (USD); Mount: Surface Mount; Case/Package: TQFP; Number of Pins: 32; Min Operating Temperature: -40°C; Max Operating Temperature: 85°C; Packaging: Tray; Memory Type: FLASH; Memory Size: 16KB; Core Architecture: AVR; Max Frequency: 20MHz; Number of I2C Channels: 1; Package Quantity: 250; Length: 7.1mm; Width: 7.1mm; Height: 1.05mm; RoHS Compliant: No; Reach SVHC Compliant: Yes; ComponentLink1URL: http://www.farnell.com/datasheets/2047954.pdf?src-supplier=Farnell; ComponentLink1Description: http://www.farnell.com/datasheets/2047954.pdf?src-supplier=Farnell; ComponentLink2URL: http://www.mouser.com/ds/2/268/Atmel-42176-ATmega48PB-88PB-168PB_Datasheet-1065517.pdf?src-supplier=Mouser; ComponentLink2Description: http://www.mouser.com/ds/2/268/Atmel-42176-ATmega48PB-88PB-168PB_Datasheet-1065517.pdf?src-supplier=Mouser; ComponentLink3URL: http://www.farnell.com/datasheets/2047954.pdf?src-supplier=Element14; ComponentLink3Description: http://www.farnell.com/datasheets/2047954.pdf?src-supplier=Element14; ComponentLink4URL: http://www.microchip.com/mymicrochip/filehandler.aspx?ddocname=en590613&src-supplier=Digi-Key; ComponentLink4Description: http://www.microchip.com/mymicrochip/filehandler.aspx?ddocname=en590613&src-supplier=Digi-Key; Supplier 1: microchipDIRECT; Supplier 2: Digi-Key; Supplier 3: Heisener; Supplier Part Number 1: ATMEGA168PB-AU; Supplier Part Number 2: ATMEGA168PB-AU-ND; Supplier Part Number 3: ATMEGA168PB-AU
footprint IC_MCU_Microchip_32A_IPC_A (7x7x1.0 mm Body, 2.00 mm (TQFN))
pins: 1 PD3(INT1/OC2B/PCINT19), 2 PD4(T0/XCK/PCINT20), 3 PE0(ACO), 4 VCC (power), 5 GND (power), 6 PE1, 7 PB6(TOSC1/XTAL1/PCINT6), 8 PB7(TOSC2/XTAL2/PCINT7), 9 PD5(T1/OC0B/PCINT21), 10 PD6(AIN0/OC0A/PCINT22), 11 PD7(AIN1/PCINT23), 12 PB0(ICP1/CLKO/PCINT0), 13 PB1(OC1A/PCINT1), 14 PB2(OC1B/~{SS}/PCINT2), 15 PB3(OC2A/MOSI/PCINT3), 16 PB4(MISO/PCINT4), 17 PB5(SCK/PCINT5), 18 AVCC (power), 19 PE2(ADC6), 20 AREF (power), 21 GND (power), 22 PE3(ADC7), 23 PC0(ADC0/PCINT8), 24 PC1(ADC1/PCINT9), 25 PC2(ADC2/PCINT10), 26 PC3(ADC3/PCINT11), 27 PC4(ADC4/SDA/PCINT12), 28 PC5(ADC5/SCL/PCINT13), 29 PC6(~{RESET}/PCINT14), 30 PD0(RXD/PCINT16), 31 PD1(TXD/PCINT17), 32 PD2(INT0/PCINT18)

## IC_MCU_AVR_16KB_ATTINY1616-MNR
designator U?, comment ATTINY1616-MNR
8-bit AVR MCU, 16 KB, 2048 Bytes, 20 MHz, 1.8 to 5.5V, VQFN-20, RoHS; Manufacturer: Microchip; Interface: I2C,SPI,IrDA,UART,USART; Peripherals: Brown-out Detect/Reset,POR,PWM,WDT; Memory Type: FLASH; Frequency: 20MHz; Number of I/Os: 18; Memory Size: 16KB; Oscillator Type: Internal; Manufacturer Part Number: ATTINY1616-MNR; RoHS: Yes; Category: Microcontrollers; Stock 1: 60977; Pricing 1: 1=1.05000, 25=0.96600, 100=0.87000 (USD); Case/Package: VQFN; Min Operating Temperature: -40°C; Max Operating Temperature: 105°C; Packaging: Cut Tape; Core Architecture: AVR; RoHS Compliant: Yes; ComponentLink1URL: http://www.microchip.com/mymicrochip/filehandler.aspx?ddocname=en606269&src-supplier=Digi-Key; ComponentLink1Description: http://www.microchip.com/mymicrochip/filehandler.aspx?ddocname=en606269&src-supplier=Digi-Key; Supplier 1: Digi-Key; Supplier 2: Verical; Supplier 3: Heisener; Supplier Part Number 1: ATTINY1616-MNRDKR-ND; Supplier Part Number 2: ATTINY1616-MNR; Supplier Part Number 3: ATTINY1616-MNR
footprint IC_MCU_Microchip_C04-21380_IPC_C (20-vqfn)
pins: 1 PA2, 2 EXTCLK/PA3, 3 GND (power), 4 VDD (power), 5 PA4, 6 PA5, 7 PA6, 8 PA7, 9 PB5, 10 PB4, 11 PB3/TOSC1, 12 PB2/TOSC2, 13 PB1, 14 PB0, 15 PC0, 16 PC1, 17 PC2, 18 PC3, 19 PA0/~{RESET}/UPDI, 20 PA1, 21 EP (power)

## IC_MCU_ESP32-C6-MINI-1-N4
designator U?, comment ESP32-C6-MINI-1-N4
Rf Txrx Module Bt Pcb Trace SMD; Manufacturer: Espressif Systems; Supplier 1: Digikey; Manufacturer Part Number: ESP32-C6-MINI-1-N4; RoHS: No; Stock 1: 29; Pricing 1: 1=2.5 (USD); Supplier Part Number 1: 1965-ESP32-C6-MINI-1-N4CT-ND
footprint IC_ESP32-C6-MINI-1-N4
part A pins: 3 3V3, 5 IO2, 6 IO3, 8 EN, 9 IO4, 10 IO5, 12 IO0, 13 IO1, 15 IO6, 16 IO7, 17 IO12, 18 IO13, 19 IO14, 20 IO15, 22 IO8, 23 IO9, 24 IO18, 25 IO19, 26 IO20, 27 IO21, 28 IO22, 29 IO23, 30 RXD0, 31 TXD0
part B pins: 1 GND1 (power), 2 GND1 (power), 4 NC, 7 NC, 11 GND1 (power), 14 GND1 (power), 21 NC, 32 NC, 33 NC, 34 NC, 35 NC, 36 GND1 (power), 37 GND1 (power), 38 GND1 (power), 39 GND1 (power), 40 GND1 (power), 41 GND1 (power), 42 GND1 (power), 43 GND1 (power), 44 GND1 (power), 45 GND1 (power), 46 GND1 (power), 47 GND2 (power), 48 GND2 (power), 49_1 GND2 (power), 49_2 GND2 (power), 49_3 GND2 (power), 49_4 GND2 (power), 49_5 GND2 (power), 49_6 GND2 (power), 49_7 GND2 (power), 49_8 GND2 (power), 49_9 GND2 (power), 50 GND2 (power), 51 GND2 (power), 52 GND2 (power), 53 GND2 (power)

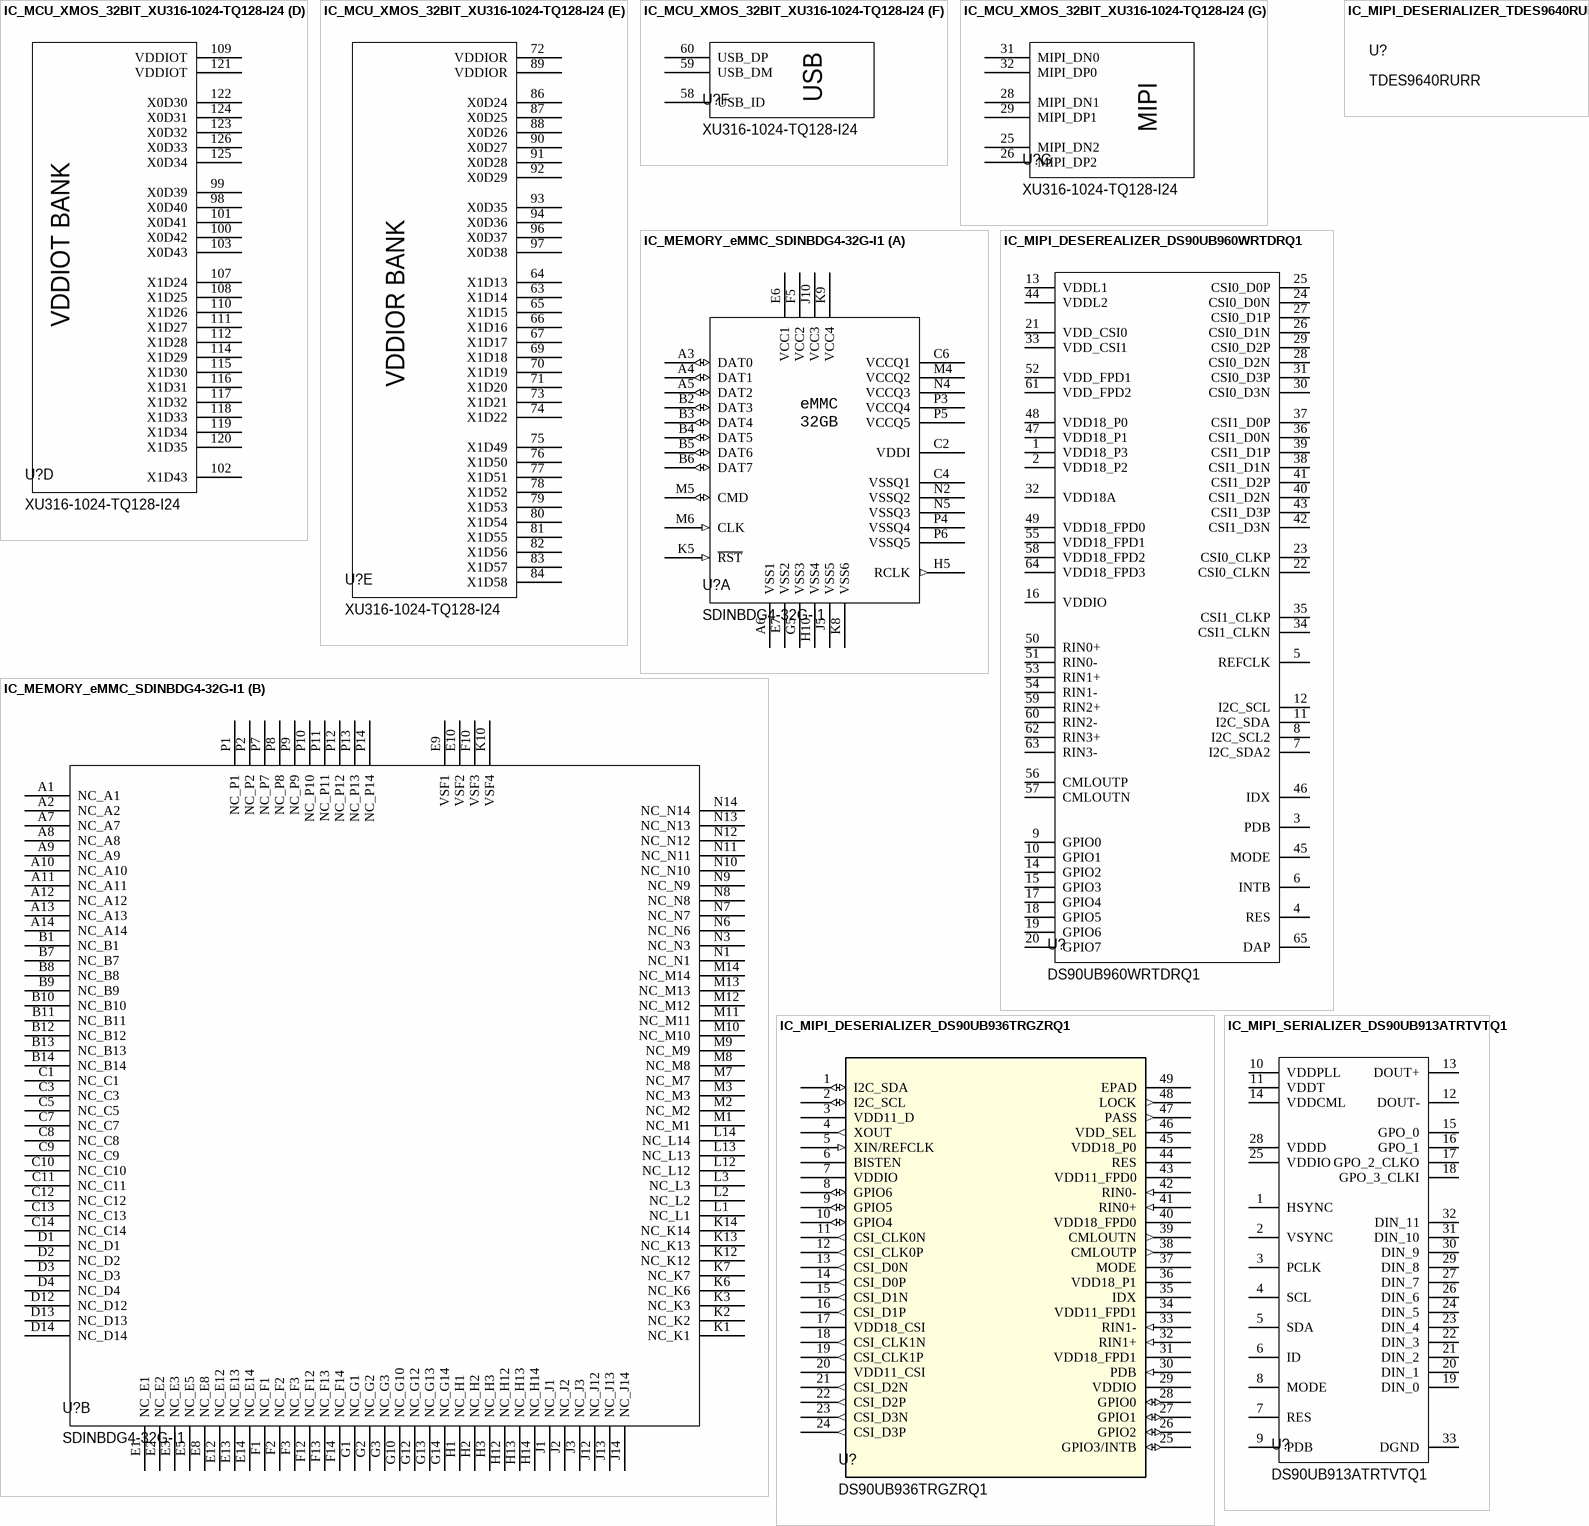
[diagram p13: symbols IC_MCU_XMOS_32BIT_XU316-1024-TQ128-I24 to IC_MIPI_SERIALIZER_DS90UB913ATRTVTQ1]

## IC_MCU_XMOS_32BIT_XU316-1024-TQ128-I24
designator U?, comment XU316-1024-TQ128-I24
IC Mcu 32 Bit 8KB Otp 128TQFP; Manufacturer: XMOS; Supplier 1: Digikey; Manufacturer Part Number: XU316-1024-TQ128-I24; RoHS: No; Stock 1: 247; Pricing 1: 1=10.66, 10=9.798, 25=9.3916, 152=8.9375 (USD); Supplier Part Number 1: 880-XU316-1024-TQ128-I24-ND
footprint IC_MCU_XMOS_TQFP128_196X196_XMO-L (128-TQFP (14x14))
part A pins: 5 VDD (power), 11 VDD (power), 14 VDD (power), 18 VDD (power), 24 MIPI_VDD18 (power), 27 MIPI_VDD09 (power), 30 GND (power), 39 VDD (power), 41 PLL_AVDD (power), 42 PLL_AGND (power), 45 VDD (power), 50 VDD (power), 54 VDD (power), 61 USB_VDD33 (power), 62 USB_VDD18 (power), 68 VDD (power), 85 VDD (power), 95 VDD (power), 104 VDD (power), 105 VDD (power), 106 VDD (power), 113 VDD (power), 129 GND (power)
part B pins: 33 XOUT, 34 XIN, 35 VDDIOB18 (power), 36 TDI, 37 TDO, 38 RST_N, 40 LV_L_N, 43 LV_T_N, 44 TMS, 46 X0D12, 47 X0D13, 48 X0D22, 49 X0D23, 51 TCK, 52 LV_R_N, 53 X1D12, 55 NC, 56 VDDIOB18 (power), 57 X1D23
part C pins: 1 X0D06, 2 X0D01, 3 X0D07, 4 X0D10, 6 X0D00, 7 X0D11, 8 X0D14, 9 X0D16, 10 VDDIOL (power), 12 X1D36, 13 X1D37, 15 X1D38, 16 X1D39, 17 VDDIOL (power), 19 X1D00, 20 X1D01, 21 X1D09, 22 X1D10, 23 X1D11, 127 X0D04, 128 X0D05
part D pins: 98 X0D40, 99 X0D39, 100 X0D42, 101 X0D41, 102 X1D43, 103 X0D43, 107 X1D24, 108 X1D25, 109 VDDIOT (power), 110 X1D26, 111 X1D27, 112 X1D28, 114 X1D29, 115 X1D30, 116 X1D31, 117 X1D32, 118 X1D33, 119 X1D34, 120 X1D35, 121 VDDIOT (power), 122 X0D30, 123 X0D32, 124 X0D31, 125 X0D34, 126 X0D33
part E pins: 63 X1D14, 64 X1D13, 65 X1D15, 66 X1D16, 67 X1D17, 69 X1D18, 70 X1D19, 71 X1D20, 72 VDDIOR (power), 73 X1D21, 74 X1D22, 75 X1D49, 76 X1D50, 77 X1D51, 78 X1D52, 79 X1D53, 80 X1D54, 81 X1D55, 82 X1D56, 83 X1D57, 84 X1D58, 86 X0D24, 87 X0D25, 88 X0D26, 89 VDDIOR (power), 90 X0D27, 91 X0D28, 92 X0D29, 93 X0D35, 94 X0D36, 96 X0D37, 97 X0D38
part F pins: 58 USB_ID, 59 USB_DM, 60 USB_DP
part G pins: 25 MIPI_DN2, 26 MIPI_DP2, 28 MIPI_DN1, 29 MIPI_DP1, 31 MIPI_DN0, 32 MIPI_DP0

## IC_MEMORY_eMMC_SDINBDG4-32G-I1
designator U?, comment SDINBDG4-32G-I1
Inand 7250 32GB Industrial Wide Temp -25C+85C EMMC5.1 HS400; Manufacturer: SanDisk; Supplier 1: Mouser; Manufacturer Part Number: SDINBDG4-32G-I1; RoHS: No; Category: Uncategorized; Stock 1: 1018; Pricing 1: 1=26.46, 10=24.64, 50=23.78, 100=20.87, 1000=20.16, 10000=20.16 (USD); RoHS Compliant: No; Supplier Part Number 1: 467-SDINBDG4-32G-I1
footprint IC_MEMORY_eMMC (FBGA153_0P5_11P5X13)
part A pins: A3 DAT0 (io), A4 DAT1 (io), A5 DAT2 (io), A6 VSS1 (power), B2 DAT3 (io), B3 DAT4 (io), B4 DAT5 (io), B5 DAT6 (io), B6 DAT7 (io), C2 VDDI (power), C4 VSSQ1 (power), C6 VCCQ1 (power), E6 VCC1 (power), E7 VSS2 (power), F5 VCC2 (power), G5 VSS3 (power), H5 RCLK (out), H10 VSS4 (power), J5 VSS5 (power), J10 VCC3 (power), K5 ~{RST} (in), K8 VSS6 (power), K9 VCC4 (power), M4 VCCQ2 (power), M5 CMD (io), M6 CLK (in), N2 VSSQ2 (power), N4 VCCQ3 (power), N5 VSSQ3 (power), P3 VCCQ4 (power), P4 VSSQ4 (power), P5 VCCQ5 (power), P6 VSSQ5 (power)
part B pins: A1 NC_A1, A2 NC_A2, A7 NC_A7, A8 NC_A8, A9 NC_A9, A10 NC_A10, A11 NC_A11, A12 NC_A12, A13 NC_A13, A14 NC_A14, B1 NC_B1, B7 NC_B7, B8 NC_B8, B9 NC_B9, B10 NC_B10, B11 NC_B11, B12 NC_B12, B13 NC_B13, B14 NC_B14, C1 NC_C1, C3 NC_C3, C5 NC_C5, C7 NC_C7, C8 NC_C8, C9 NC_C9, C10 NC_C10, C11 NC_C11, C12 NC_C12, C13 NC_C13, C14 NC_C14, D1 NC_D1, D2 NC_D2, D3 NC_D3, D4 NC_D4, D12 NC_D12, D13 NC_D13, D14 NC_D14, E1 NC_E1, E2 NC_E2, E3 NC_E3, E5 NC_E5, E8 NC_E8, E9 VSF1, E10 VSF2, E12 NC_E12, E13 NC_E13, E14 NC_E14, F1 NC_F1, F2 NC_F2, F3 NC_F3, F10 VSF3, F12 NC_F12, F13 NC_F13, F14 NC_F14, G1 NC_G1, G2 NC_G2, G3 NC_G3, G10 NC_G10, G12 NC_G12, G13 NC_G13, G14 NC_G14, H1 NC_H1, H2 NC_H2, H3 NC_H3, H12 NC_H12, H13 NC_H13, H14 NC_H14, J1 NC_J1, J2 NC_J2, J3 NC_J3, J12 NC_J12, J13 NC_J13, J14 NC_J14, K1 NC_K1, K2 NC_K2, K3 NC_K3, K6 NC_K6, K7 NC_K7, K10 VSF4, K12 NC_K12, K13 NC_K13, K14 NC_K14, L1 NC_L1, L2 NC_L2, L3 NC_L3, L12 NC_L12, L13 NC_L13, L14 NC_L14, M1 NC_M1, M2 NC_M2, M3 NC_M3, M7 NC_M7, M8 NC_M8, M9 NC_M9, M10 NC_M10, M11 NC_M11, M12 NC_M12, M13 NC_M13, M14 NC_M14, N1 NC_N1, N3 NC_N3, N6 NC_N6, N7 NC_N7, N8 NC_N8, N9 NC_N9, N10 NC_N10, N11 NC_N11, N12 NC_N12, N13 NC_N13, N14 NC_N14, P1 NC_P1, P2 NC_P2, P7 NC_P7, P8 NC_P8, P9 NC_P9, P10 NC_P10, P11 NC_P11, P12 NC_P12, P13 NC_P13, P14 NC_P14

## IC_MIPI_DESEREALIZER_DS90UB960WRTDRQ1
designator U?, comment DS90UB960WRTDRQ1
Quad 2 MP camera hub FPD-Link III deserializer with dual CSI-2 output ports 64-VQFN -40 to 105; Manufacturer: Texas Instruments; Supplier 1: Texas Instruments; Manufacturer Part Number: DS90UB960WRTDRQ1; RoHS: Yes; Category: Integrated Circuits (ICs); Stock 1: 6702; Pricing 1: 1=18.26, 100=15.95, 250=12.298, 1000=11 (USD); Min Operating Temperature: -40°C; Max Operating Temperature: 105°C; RoHS Compliant: Yes; ComponentLink1URL: http://www.ti.com/general/docs/suppproductinfo.tsp?distId=10&amp;gotoUrl=http%3A%2F%2Fwww.ti.com%2Flit%2Fgpn%2Fds90ub960-q1&src-supplier=Digikey; ComponentLink1Description: http://www.ti.com/general/docs/suppproductinfo.tsp?distId=10&amp;gotoUrl=http%3A%2F%2Fwww.ti.com%2Flit%2Fgpn%2Fds90ub960-q1&src-supplier=Digikey; Supplier Part Number 1: DS90UB960WRTDRQ1
footprint IC_DESERIALIZER_QFN50P900X900X90-65N-D
pins: 1 VDD18_P3, 2 VDD18_P2, 3 PDB, 4 RES, 5 REFCLK, 6 INTB, 7 I2C_SDA2, 8 I2C_SCL2, 9 GPIO0, 10 GPIO1, 11 I2C_SDA, 12 I2C_SCL, 13 VDDL1, 14 GPIO2, 15 GPIO3, 16 VDDIO, 17 GPIO4, 18 GPIO5, 19 GPIO6, 20 GPIO7, 21 VDD_CSI0, 22 CSI0_CLKN, 23 CSI0_CLKP, 24 CSI0_D0N, 25 CSI0_D0P, 26 CSI0_D1N, 27 CSI0_D1P, 28 CSI0_D2N, 29 CSI0_D2P, 30 CSI0_D3N, 31 CSI0_D3P, 32 VDD18A, 33 VDD_CSI1, 34 CSI1_CLKN, 35 CSI1_CLKP, 36 CSI1_D0N, 37 CSI1_D0P, 38 CSI1_D1N, 39 CSI1_D1P, 40 CSI1_D2N, 41 CSI1_D2P, 42 CSI1_D3N, 43 CSI1_D3P, 44 VDDL2, 45 MODE, 46 IDX, 47 VDD18_P1, 48 VDD18_P0, 49 VDD18_FPD0, 50 RIN0+, 51 RIN0-, 52 VDD_FPD1, 53 RIN1+, 54 RIN1-, 55 VDD18_FPD1, 56 CMLOUTP, 57 CMLOUTN, 58 VDD18_FPD2, 59 RIN2+, 60 RIN2-, 61 VDD_FPD2, 62 RIN3+, 63 RIN3-, 64 VDD18_FPD3, 65 DAP

## IC_MIPI_DESERIALIZER_DS90UB936TRGZRQ1
designator U?, comment DS90UB936TRGZRQ1
1MP MIPI CSI-2 FPD-Link III Deserializer for 1MP/60fps & 2MP/30 fps 48-VQFN -40 to 105; Manufacturer: Texas Instruments; Data Rate: 2.5Gbps; Number of Inputs: 2; Number of Outputs: 12; Supplier 1: Digikey; Manufacturer Part Number: DS90UB936TRGZRQ1; RoHS: Yes; Category: Integrated Circuits (ICs); Stock 1: 5660; Pricing 1: 1=11.04, 10=8.641, 25=8.0416, 100=7.3829, 250=7.0688, 500=6.87954, 1000=6.72374, 2500=6.1475 (USD); Mount: Surface Mount; Case/Package: VQFN; Min Operating Temperature: -40°C; Max Operating Temperature: 105°C; Packaging: Cut Tape; Series: Automotive, AEC-Q100; RoHS Compliant: Yes; ComponentLink1URL: http://www.ti.com/general/docs/suppproductinfo.tsp?distId=10&amp;gotoUrl=http%3A%2F%2Fwww.ti.com%2Flit%2Fgpn%2Fds90ub936-q1&src-supplier=Digikey; ComponentLink1Description: http://www.ti.com/general/docs/suppproductinfo.tsp?distId=10&amp;gotoUrl=http%3A%2F%2Fwww.ti.com%2Flit%2Fgpn%2Fds90ub936-q1&src-supplier=Digikey; Supplier Part Number 1: 296-49445-1-ND
footprint IC_DESERIALIZER_RGZ48_TEX
pins: 1 I2C_SDA (io), 2 I2C_SCL (io), 3 VDD11_D (power), 4 XOUT (out), 5 XIN/REFCLK (in), 6 BISTEN, 7 VDDIO (power), 8 GPIO6 (io), 9 GPIO5 (io), 10 GPIO4 (io), 11 CSI_CLK0N (out), 12 CSI_CLK0P (out), 13 CSI_D0N (out), 14 CSI_D0P (out), 15 CSI_D1N (out), 16 CSI_D1P (out), 17 VDD18_CSI (power), 18 CSI_CLK1N (out), 19 CSI_CLK1P (out), 20 VDD11_CSI (power), 21 CSI_D2N (out), 22 CSI_D2P (out), 23 CSI_D3N (out), 24 CSI_D3P (out), 25 GPIO3/INTB (io), 26 GPIO2 (io), 27 GPIO1 (io), 28 GPIO0 (io), 29 VDDIO (power), 30 PDB (in), 31 VDD18_FPD1 (power), 32 RIN1+ (in), 33 RIN1- (in), 34 VDD11_FPD1 (power), 35 IDX, 36 VDD18_P1 (power), 37 MODE, 38 CMLOUTP (out), 39 CMLOUTN (out), 40 VDD18_FPD0 (power), 41 RIN0+ (in), 42 RIN0- (in), 43 VDD11_FPD0 (power), 44 RES, 45 VDD18_P0 (power), 46 VDD_SEL (power), 47 PASS (out), 48 LOCK (out), 49 EPAD